# Altium footprint library DrPCB.PcbLib: 910 footprints (part 1 of 57)
Each footprint in its own frame and in the unit in brackets; x right, y up, seen from the top. Pads: shape width x height; smd on the part's side, far side on the other; paste and mask are expansions set on the pad; w line width, h text height; cw(c..) or ccw(c..) is an arc to the next point about the centre after c.
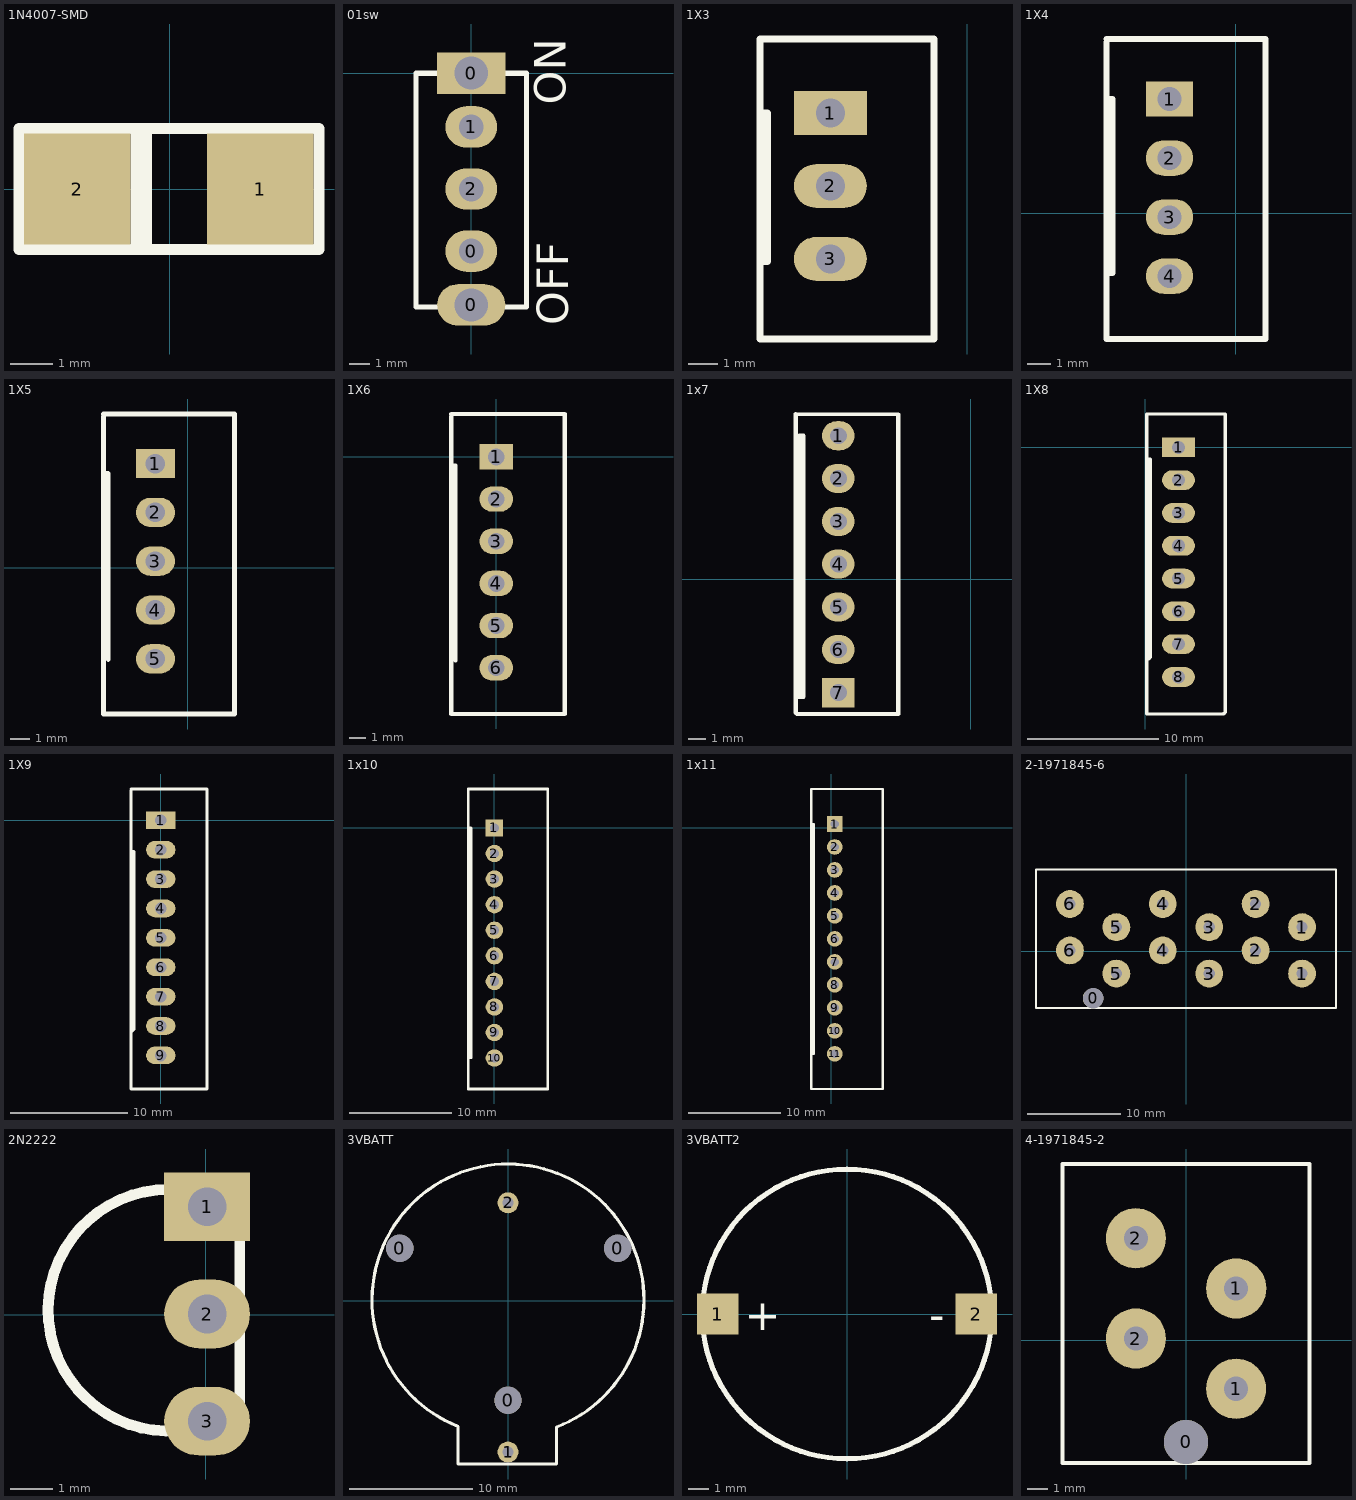
[diagram p0: the footprints below, top view; thin cyan lines are the x and y axes]

## 1N4007-SMD [mm]
pads (2):
  rect 2.5x2.6 smd: 1(2.121,0.005) 2(-2.172,0.005)
Top Overlay:
  lines w0.254: -3.543,-1.418 -3.543,1.427 3.505,1.427 3.505,-1.418 -3.531,-1.418 ; -0.8,-1.418 -0.8,1.427 ; -0.546,-1.418 -0.546,1.427

## 01sw [mm]
pads (5):
  oval 3.3x2 hole 1.6: 0(0,-11.2)
  oval 2.5x2 hole 1.2: 0(0,-8.6) 1(0,-2.6) 2(0,-5.6)
  rect 3.3x2 hole 1.6: 0(0,0)
Top Overlay:
  lines w0.254: -2.667,-11.303 -2.667,0 2.667,0 2.667,-11.303 -2.667,-11.303
  text "OFF" at 4.699,-12.192 h1.52
  text "ON" at 4.572,-1.524 h1.52

## 1X3 [mm]
pads (3):
  rect 2.5x1.5 hole 1: 1(-4.699,9.017)
  oval 2.5x1.5 hole 1: 2(-4.699,6.517) 3(-4.699,4.017)
Top Overlay:
  lines w0.254: -7.112,3.937 -6.858,3.937 -6.858,9.017 -7.112,9.017 ; -7.112,1.27 -1.143,1.27 -1.143,11.557 -7.112,11.557 -7.112,1.27

## 1X4 [mm]
pads (4):
  rect 2x1.5 hole 1: 1(-2.794,4.826)
  oval 2x1.5 hole 1: 2(-2.794,2.326) 3(-2.794,-0.174) 4(-2.794,-2.674)
Top Overlay:
  lines w0.254: -5.461,-2.54 -5.207,-2.54 -5.207,4.826 -5.334,4.826 -5.461,4.826 ; -5.461,7.239 -5.461,-5.334 1.27,-5.334 1.27,7.366 -5.461,7.366

## 1X5 [mm]
pads (5):
  rect 2x1.5 hole 1: 1(-1.651,5.334)
  oval 2x1.5 hole 1: 2(-1.651,2.834) 3(-1.651,0.334) 4(-1.651,-2.166) 5(-1.651,-4.666)
Top Overlay:
  lines w0.254: -4.318,4.826 -4.064,4.826 -4.064,-4.699 ; -4.318,7.747 -4.318,-7.493 2.413,-7.493 2.413,7.874 -4.318,7.874

## 1X6 [mm]
pads (6):
  rect 2x1.5 hole 1: 1(0,0)
  oval 2x1.5 hole 1: 2(0,-2.5) 3(0,-5) 4(0,-7.5) 5(0,-10) 6(0,-12.5)
Top Overlay:
  lines w0.254: -2.667,-0.508 -2.413,-0.508 -2.413,-12.065 ; -2.667,2.413 -2.667,-15.24 4.064,-15.24 4.064,2.54 -2.667,2.54

## 1x7 [mil]
pads (7):
  oval 75x67 hole 39: 1(-305,330) 2(-305,232) 3(-305,133) 4(-305,35) 5(-305,-64) 6(-305,-162)
  rect 75x67 hole 39: 7(-305,-261)
Top Overlay:
  lines w10: -403,-270 -395,-270 ; -395,-270 -395,330 -385,330 -385,-270 -395,-270 ; -403,-307 -403,380 -167,379 -167,-310 -400,-310 -403,-307

## 1X8 [mm]
pads (8):
  rect 2.5x1.5 hole 1: 1(2.54,0)
  oval 2.5x1.5 hole 1: 2(2.54,-2.5) 3(2.54,-5) 4(2.54,-7.5) 5(2.54,-10) 6(2.54,-12.5) 7(2.54,-15) 8(2.54,-17.5)
Top Overlay:
  lines w0.254: 0.127,-0.889 0.381,-0.889 0.381,-16.002 0.254,-16.129 ; 0.127,-20.32 5.969,-20.32 6.096,-20.193 6.096,2.54 0.127,2.54 0.127,-20.32

## 1X9 [mm]
pads (9):
  rect 2.5x1.5 hole 1: 1(0,0)
  oval 2.5x1.5 hole 1: 2(0,-2.5) 3(0,-5) 4(0,-7.5) 5(0,-10) 6(0,-12.5) 7(0,-15) 8(0,-17.5) 9(0,-20)
Top Overlay:
  lines w0.254: -2.54,-2.667 -2.286,-2.667 -2.286,-17.78 -2.413,-17.907 ; -2.54,2.54 -2.54,-22.86 3.937,-22.86 3.937,2.667 -2.54,2.667

## 1x10 [mm]
pads (10):
  rect 1.7x1.7 hole 0.9: 1(0,0)
  round 1.7 hole 0.9: 2(0,-2.5) 3(0,-5) 4(0,-7.5) 5(0,-10) 6(0,-12.5) 7(0,-15) 8(0,-17.5) 9(0,-20) 10(0,-22.5)
Top Overlay:
  lines w0.254: -2.54,-22.479 -2.286,-22.479 -2.286,0 -2.54,0 ; -2.54,-25.527 5.207,-25.527 5.207,3.81 -2.54,3.81 -2.54,-25.527

## 1x11 [mm]
pads (11):
  rect 1.7x1.7 hole 0.9: 1(0.381,0.381)
  round 1.7 hole 0.9: 2(0.381,-2.119) 3(0.381,-4.619) 4(0.381,-7.119) 5(0.381,-9.619) 6(0.381,-12.119) 7(0.381,-14.619) 8(0.381,-17.119) 9(0.381,-19.619) 10(0.381,-22.119) 11(0.381,-24.619)
Top Overlay:
  lines w0.254: -2.159,-24.638 -1.905,-24.638 -1.905,0.381 -2.159,0.381 ; -2.159,-28.448 5.588,-28.448 5.588,4.191 -2.159,4.191 -2.159,-28.448

## 2-1971845-6 [mm]
pads (13):
  round 2.2 hole 2.2: 0(-10,-5.075)
  round 3 hole 1.2: 1(12.5,-2.425) 1(12.5,2.575) 2(7.5,0.075) 2(7.5,5.075) 3(2.5,-2.425) 3(2.5,2.575) 4(-2.5,0.075) 4(-2.5,5.075) 5(-7.5,-2.425) 5(-7.5,2.575) 6(-12.5,0.075) 6(-12.5,5.075)
Top Overlay:
  lines w0.2: -16.15,8.773 16.15,8.773 16.15,-6.125 -16.15,-6.125 -16.15,8.775
3D body "c-2-1971845-6-b-3d.stp": height 12.81, standoff -3.49, extent -16.15,-6.201 16.15,8.849

## 2N2222 [mm]
pads (3):
  rect 2x1.6 hole 0.9: 1(0.034,2.518)
  oval 2x1.6 hole 0.9: 2(0.034,0.018) 3(0.034,-2.482)
Top Overlay:
  lines w0.254: 0.734,-2.225 cw(c-0.855,0.105) 0.796,2.391 0.796,-2.181

## 3VBATT [mm]
pads (5):
  round 2.2 hole 2.2: 0(-8.772,4.239) 0(-0.009,-8.08) 0(8.881,4.239)
  round 1.7 hole 0.9: 1(-0.009,-12.271) 2(-0.009,7.922)
Top Overlay:
  lines w0.254: -4.073,-10.239 -4.073,-13.239 3.927,-13.239 3.927,-10.239 ccw(c-0.009,0.048) -4.056,-10.196

## 3VBATT2 [mm]
pads (2):
  rect 2x2 smd: 1(-6.25,0) 2(6.25,0)
Top Overlay:
  circle w0.254: c0,0 r7
  text "+" at -4.953,-0.775 h1.52
  text "-" at 3.975,-0.775 h1.52

## 4-1971845-2 [mm]
pads (5):
  round 2.2 hole 2.2: 0(0,-5.075)
  round 3 hole 1.2: 1(2.498,-2.425) 1(2.5,2.575) 2(-2.5,0.075) 2(-2.5,5.075)
Top Overlay:
  lines w0.2: -6.15,8.775 -6.15,-6.125 6.148,-6.125 6.148,8.773 -6.148,8.773
3D body "c-4-1971845-2-b-3d.stp": height 12.81, standoff -3.49, extent -6.151,-6.201 6.149,8.849